# Altium footprint library InductorsRLB.PcbLib: 18 footprints (part 2 of 2)
Each footprint in its own frame and in the unit in brackets; x right, y up, seen from the top. Pads: shape width x height; smd on the part's side, far side on the other; paste and mask are expansions set on the pad; w line width, h text height; cw(c..) or ccw(c..) is an arc to the next point about the centre after c.
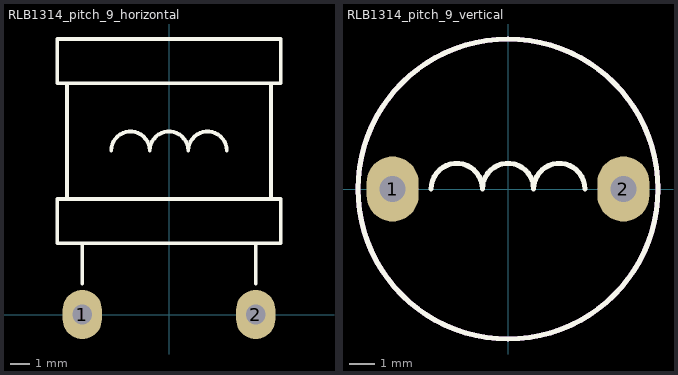
[diagram p1: the footprints below, top view; thin cyan lines are the x and y axes]

## RLB1314_pitch_9_horizontal [mil]
pads (2):
  oval 80x100 hole 40 mask+2.76: 1(-177.17,0) 2(177.17,0)
Top Overlay:
  lines w7.87: -208.66,236.22 -208.66,472.44 ; -177.17,62.99 -177.17,145.67 ; -118.11,334.65 cw(c-78.74,334.65) -39.37,334.65 cw(c0,334.65) 39.37,334.65 cw(c78.74,334.65) 118.11,334.65 ; 177.17,62.99 177.17,145.67 ; 208.66,236.22 208.66,472.44 ; -228.35,145.67 -228.35,236.22 228.35,236.22 228.35,145.67 -228.35,145.67 ; -228.35,472.44 228.35,472.44 228.35,562.99 -228.35,562.99 -228.35,472.44
3D body "RLB1314_pitch9_horizontal.stp": height 464.57, standoff -118.11, extent -230.32,-15.74 230.31,566.93

## RLB1314_pitch_9_vertical [mil]
pads (2):
  oval 80x100 hole 40 mask+2.76: 1(-177.17,0) 2(177.17,0)
Top Overlay:
  circle w7.87: c0,0 r230.31
  lines w7.87: -118.11,0 cw(c-78.74,0) -39.37,0 cw(c0,0) 39.37,0 cw(c78.74,0) 118.11,0
Mechanical 3:
  circle w7.87: c0,0 r230.31
  lines w7.87: -212.6,0 -141.73,0 ; -177.17,-35.43 -177.17,35.43 ; 141.73,0 212.6,0 ; 177.17,-35.43 177.17,35.43
3D body "RLB1314_pitch9_vertical.stp": height 472.44, standoff -118.11, extent -230.32,-230.31 230.31,230.32